# Altium footprint library Connector_PinHeader_1.00mm.PcbLib: 278 footprints (part 6 of 18) (continued)
## PinHeader_1x23_P1.00mm_Horizontal [mm] (continued)
  text "'.Designator'" at 1.254,-13.428 h0.6

## PinHeader_1x23_P1.00mm_Vertical [mm]
pads (23):
  rect 0.85x0.85 hole 0.5: 1(0,0)
  rrect100% 0.85x0.85 hole 0.5: 2(0,-1) 3(0,-2) 4(0,-3) 5(0,-4) 6(0,-5) 7(0,-6) 8(0,-7) 9(0,-8) 10(0,-9) 11(0,-10) 12(0,-11) 13(0,-12) 14(0,-13) 15(0,-14) 16(0,-15) 17(0,-16) 18(0,-17) 19(0,-18) 20(0,-19) 21(0,-20) 22(0,-21) 23(0,-22)
F.SilkS:
  lines w0.12: -0.695,0 -0.695,0.685 0,0.685 ; -0.608,-0.685 -0.695,-0.685 -0.695,-22.56 -0.394,-22.56 ; 0.394,-22.56 0.695,-22.56 0.695,-0.685 0.608,-0.685
F.CrtYd:
  lines w0.05: -1.15,-23 -1.15,1 1.15,1 1.15,-23 -1.15,-23
F.Fab:
  lines w0.1: -0.635,-22.5 -0.635,0.182 -0.318,0.5 0.635,0.5 0.635,-22.5 -0.635,-22.5
  text "'.Designator'" at 0.639,-14.076 h0.76

## PinHeader_1x23_P1.00mm_Vertical_SMD_Pin1Left [mm]
pads (23):
  rect 1.75x0.6 smd: 1(-0.875,11) 2(0.875,10) 3(-0.875,9) 4(0.875,8) 5(-0.875,7) 6(0.875,6) 7(-0.875,5) 8(0.875,4) 9(-0.875,3) 10(0.875,2) 11(-0.875,1) 12(0.875,0) 13(-0.875,-1) 14(0.875,-2) 15(-0.875,-3) 16(0.875,-4) 17(-0.875,-5) 18(0.875,-6) 19(-0.875,-7) 20(0.875,-8) 21(-0.875,-9) 22(0.875,-10) 23(-0.875,-11)
F.SilkS:
  lines w0.12: -1.69,11.56 -0.695,11.56 0.695,11.56 0.695,10.56 ; -0.695,-11.56 0.695,-11.56 0.695,-10.56 ; -0.695,-10.44 -0.695,-9.56 ; -0.695,-8.44 -0.695,-7.56 ; -0.695,-6.44 -0.695,-5.56 ; -0.695,-4.44 -0.695,-3.56 ; -0.695,-2.44 -0.695,-1.56 ; -0.695,-0.44 -0.695,0.44 ; -0.695,1.56 -0.695,2.44 ; -0.695,3.56 -0.695,4.44 ; -0.695,5.56 -0.695,6.44 ; -0.695,7.56 -0.695,8.44 ; -0.695,9.56 -0.695,10.44 ; 0.695,-9.44 0.695,-8.56 ; 0.695,-7.44 0.695,-6.56 ; 0.695,-5.44 0.695,-4.56 ; 0.695,-3.44 0.695,-2.56 ; 0.695,-1.44 0.695,-0.56 ; 0.695,0.56 0.695,1.44 ; 0.695,2.56 0.695,3.44 ; 0.695,4.56 0.695,5.44 ; 0.695,6.56 0.695,7.44 ; 0.695,8.56 0.695,9.44
F.CrtYd:
  lines w0.05: -2.25,-12 -2.25,12 2.25,12 2.25,-12 -2.25,-12
F.Fab:
  lines w0.1: -0.635,-11.15 -1.25,-11.15 -1.25,-10.85 -0.635,-10.85 ; -0.635,-9.15 -1.25,-9.15 -1.25,-8.85 -0.635,-8.85 ; -0.635,-7.15 -1.25,-7.15 -1.25,-6.85 -0.635,-6.85 ; -0.635,-5.15 -1.25,-5.15 -1.25,-4.85 -0.635,-4.85 ; -0.635,-3.15 -1.25,-3.15 -1.25,-2.85 -0.635,-2.85 ; -0.635,-1.15 -1.25,-1.15 -1.25,-0.85 -0.635,-0.85 ; -0.635,0.85 -1.25,0.85 -1.25,1.15 -0.635,1.15 ; -0.635,2.85 -1.25,2.85 -1.25,3.15 -0.635,3.15 ; -0.635,4.85 -1.25,4.85 -1.25,5.15 -0.635,5.15 ; -0.635,6.85 -1.25,6.85 -1.25,7.15 -0.635,7.15 ; -0.635,8.85 -1.25,8.85 -1.25,9.15 -0.635,9.15 ; -0.635,10.85 -1.25,10.85 -1.25,11.15 -0.635,11.15 ; 0.635,-10.15 1.25,-10.15 1.25,-9.85 0.635,-9.85 ; 0.635,-8.15 1.25,-8.15 1.25,-7.85 0.635,-7.85 ; 0.635,-6.15 1.25,-6.15 1.25,-5.85 0.635,-5.85 ; 0.635,-4.15 1.25,-4.15 1.25,-3.85 0.635,-3.85 ; 0.635,-2.15 1.25,-2.15 1.25,-1.85 0.635,-1.85 ; 0.635,-0.15 1.25,-0.15 1.25,0.15 0.635,0.15 ; 0.635,1.85 1.25,1.85 1.25,2.15 0.635,2.15 ; 0.635,3.85 1.25,3.85 1.25,4.15 0.635,4.15 ; 0.635,5.85 1.25,5.85 1.25,6.15 0.635,6.15 ; 0.635,7.85 1.25,7.85 1.25,8.15 0.635,8.15 ; 0.635,9.85 1.25,9.85 1.25,10.15 0.635,10.15 ; -0.635,11.15 -0.285,11.5 0.635,11.5 0.635,-11.5 -0.635,-11.5 -0.635,11.15
  text "'.Designator'" at 0.84,-4.047 h1

## PinHeader_1x23_P1.00mm_Vertical_SMD_Pin1Right [mm]
pads (23):
  rect 1.75x0.6 smd: 1(0.875,11) 2(-0.875,10) 3(0.875,9) 4(-0.875,8) 5(0.875,7) 6(-0.875,6) 7(0.875,5) 8(-0.875,4) 9(0.875,3) 10(-0.875,2) 11(0.875,1) 12(-0.875,0) 13(0.875,-1) 14(-0.875,-2) 15(0.875,-3) 16(-0.875,-4) 17(0.875,-5) 18(-0.875,-6) 19(0.875,-7) 20(-0.875,-8) 21(0.875,-9) 22(-0.875,-10) 23(0.875,-11)
F.SilkS:
  lines w0.12: -0.695,-10.56 -0.695,-11.56 0.695,-11.56 ; -0.695,-9.44 -0.695,-8.56 ; -0.695,-7.44 -0.695,-6.56 ; -0.695,-5.44 -0.695,-4.56 ; -0.695,-3.44 -0.695,-2.56 ; -0.695,-1.44 -0.695,-0.56 ; -0.695,0.56 -0.695,1.44 ; -0.695,2.56 -0.695,3.44 ; -0.695,4.56 -0.695,5.44 ; -0.695,6.56 -0.695,7.44 ; -0.695,8.56 -0.695,9.44 ; -0.695,11.44 -0.695,10.56 -0.695,11.56 0.695,11.56 1.69,11.56 ; 0.695,-10.44 0.695,-9.56 ; 0.695,-8.44 0.695,-7.56 ; 0.695,-6.44 0.695,-5.56 ; 0.695,-4.44 0.695,-3.56 ; 0.695,-2.44 0.695,-1.56 ; 0.695,-0.44 0.695,0.44 ; 0.695,1.56 0.695,2.44 ; 0.695,3.56 0.695,4.44 ; 0.695,5.56 0.695,6.44 ; 0.695,7.56 0.695,8.44 ; 0.695,9.56 0.695,10.44
F.CrtYd:
  lines w0.05: -2.25,-12 -2.25,12 2.25,12 2.25,-12 -2.25,-12
F.Fab:
  lines w0.1: -0.635,-10.15 -1.25,-10.15 -1.25,-9.85 -0.635,-9.85 ; -0.635,-8.15 -1.25,-8.15 -1.25,-7.85 -0.635,-7.85 ; -0.635,-6.15 -1.25,-6.15 -1.25,-5.85 -0.635,-5.85 ; -0.635,-4.15 -1.25,-4.15 -1.25,-3.85 -0.635,-3.85 ; -0.635,-2.15 -1.25,-2.15 -1.25,-1.85 -0.635,-1.85 ; -0.635,-0.15 -1.25,-0.15 -1.25,0.15 -0.635,0.15 ; -0.635,1.85 -1.25,1.85 -1.25,2.15 -0.635,2.15 ; -0.635,3.85 -1.25,3.85 -1.25,4.15 -0.635,4.15 ; -0.635,5.85 -1.25,5.85 -1.25,6.15 -0.635,6.15 ; -0.635,7.85 -1.25,7.85 -1.25,8.15 -0.635,8.15 ; -0.635,9.85 -1.25,9.85 -1.25,10.15 -0.635,10.15 ; 0.635,-11.15 1.25,-11.15 1.25,-10.85 0.635,-10.85 ; 0.635,-9.15 1.25,-9.15 1.25,-8.85 0.635,-8.85 ; 0.635,-7.15 1.25,-7.15 1.25,-6.85 0.635,-6.85 ; 0.635,-5.15 1.25,-5.15 1.25,-4.85 0.635,-4.85 ; 0.635,-3.15 1.25,-3.15 1.25,-2.85 0.635,-2.85 ; 0.635,-1.15 1.25,-1.15 1.25,-0.85 0.635,-0.85 ; 0.635,0.85 1.25,0.85 1.25,1.15 0.635,1.15 ; 0.635,2.85 1.25,2.85 1.25,3.15 0.635,3.15 ; 0.635,4.85 1.25,4.85 1.25,5.15 0.635,5.15 ; 0.635,6.85 1.25,6.85 1.25,7.15 0.635,7.15 ; 0.635,8.85 1.25,8.85 1.25,9.15 0.635,9.15 ; 0.635,10.85 1.25,10.85 1.25,11.15 0.635,11.15 ; 0.635,11.15 0.635,-11.5 -0.635,-11.5 -0.635,11.5 0.285,11.5 0.635,11.15
  text "'.Designator'" at 0.84,-4.047 h1

## PinHeader_1x24_P1.00mm_Horizontal [mm]
pads (24):
  rect 0.85x0.85 hole 0.5: 1(0,0)
  rrect100% 0.85x0.85 hole 0.5: 2(0,-1) 3(0,-2) 4(0,-3) 5(0,-4) 6(0,-5) 7(0,-6) 8(0,-7) 9(0,-8) 10(0,-9) 11(0,-10) 12(0,-11) 13(0,-12) 14(0,-13) 15(0,-14) 16(0,-15) 17(0,-16) 18(0,-17) 19(0,-18) 20(0,-19) 21(0,-20) 22(0,-21) 23(0,-22) 24(0,-23)
F.SilkS:
  lines w0.12: -0.685,0 -0.685,0.685 0,0.685 ; 0.394,-23.56 1.31,-23.56 1.31,0.56 0.685,0.56 ; 0.468,-22.5 1.31,-22.5 ; 0.468,-21.5 1.31,-21.5 ; 0.468,-20.5 1.31,-20.5 ; 0.468,-19.5 1.31,-19.5 ; 0.468,-18.5 1.31,-18.5 ; 0.468,-17.5 1.31,-17.5 ; 0.468,-16.5 1.31,-16.5 ; 0.468,-15.5 1.31,-15.5 ; 0.468,-14.5 1.31,-14.5 ; 0.468,-13.5 1.31,-13.5 ; 0.468,-12.5 1.31,-12.5 ; 0.468,-11.5 1.31,-11.5 ; 0.468,-10.5 1.31,-10.5 ; 0.468,-9.5 1.31,-9.5 ; 0.468,-8.5 1.31,-8.5 ; 0.468,-7.5 1.31,-7.5 ; 0.468,-6.5 1.31,-6.5 ; 0.468,-5.5 1.31,-5.5 ; 0.468,-4.5 1.31,-4.5 ; 0.468,-3.5 1.31,-3.5 ; 0.468,-2.5 1.31,-2.5 ; 0.468,-1.5 1.31,-1.5 ; 0.685,-0.5 1.31,-0.5 ; 1.31,-23.21 3.31,-23.21 3.31,-22.79 1.31,-22.79 ; 1.31,-22.21 3.31,-22.21 3.31,-21.79 1.31,-21.79 ; 1.31,-21.21 3.31,-21.21 3.31,-20.79 1.31,-20.79 ; 1.31,-20.21 3.31,-20.21 3.31,-19.79 1.31,-19.79 ; 1.31,-19.21 3.31,-19.21 3.31,-18.79 1.31,-18.79 ; 1.31,-18.21 3.31,-18.21 3.31,-17.79 1.31,-17.79 ; 1.31,-17.21 3.31,-17.21 3.31,-16.79 1.31,-16.79 ; 1.31,-16.21 3.31,-16.21 3.31,-15.79 1.31,-15.79 ; 1.31,-15.21 3.31,-15.21 3.31,-14.79 1.31,-14.79 ; 1.31,-14.21 3.31,-14.21 3.31,-13.79 1.31,-13.79 ; 1.31,-13.21 3.31,-13.21 3.31,-12.79 1.31,-12.79 ; 1.31,-12.21 3.31,-12.21 3.31,-11.79 1.31,-11.79 ; 1.31,-11.21 3.31,-11.21 3.31,-10.79 1.31,-10.79 ; 1.31,-10.21 3.31,-10.21 3.31,-9.79 1.31,-9.79 ; 1.31,-9.21 3.31,-9.21 3.31,-8.79 1.31,-8.79 ; 1.31,-8.21 3.31,-8.21 3.31,-7.79 1.31,-7.79 ; 1.31,-7.21 3.31,-7.21 3.31,-6.79 1.31,-6.79 ; 1.31,-6.21 3.31,-6.21 3.31,-5.79 1.31,-5.79 ; 1.31,-5.21 3.31,-5.21 3.31,-4.79 1.31,-4.79 ; 1.31,-4.21 3.31,-4.21 3.31,-3.79 1.31,-3.79 ; 1.31,-3.21 3.31,-3.21 3.31,-2.79 1.31,-2.79 ; 1.31,-2.21 3.31,-2.21 3.31,-1.79 1.31,-1.79 ; 1.31,-1.21 3.31,-1.21 3.31,-0.79 1.31,-0.79 ; 1.31,-0.21 3.31,-0.21 3.31,0.21 1.31,0.21 ; 1.31,-0.09 3.31,-0.09 ; 1.31,0.03 3.31,0.03 ; 1.31,0.15 3.31,0.15
F.CrtYd:
  lines w0.05: -1,-24 -1,1 3.75,1 3.75,-24 -1,-24
F.Fab:
  lines w0.1: 0.25,-23.15 -0.15,-23.15 -0.15,-22.85 0.25,-22.85 ; 0.25,-22.15 -0.15,-22.15 -0.15,-21.85 0.25,-21.85 ; 0.25,-21.15 -0.15,-21.15 -0.15,-20.85 0.25,-20.85 ; 0.25,-20.15 -0.15,-20.15 -0.15,-19.85 0.25,-19.85 ; 0.25,-19.15 -0.15,-19.15 -0.15,-18.85 0.25,-18.85 ; 0.25,-18.15 -0.15,-18.15 -0.15,-17.85 0.25,-17.85 ; 0.25,-17.15 -0.15,-17.15 -0.15,-16.85 0.25,-16.85 ; 0.25,-16.15 -0.15,-16.15 -0.15,-15.85 0.25,-15.85 ; 0.25,-15.15 -0.15,-15.15 -0.15,-14.85 0.25,-14.85 ; 0.25,-14.15 -0.15,-14.15 -0.15,-13.85 0.25,-13.85 ; 0.25,-13.15 -0.15,-13.15 -0.15,-12.85 0.25,-12.85 ; 0.25,-12.15 -0.15,-12.15 -0.15,-11.85 0.25,-11.85 ; 0.25,-11.15 -0.15,-11.15 -0.15,-10.85 0.25,-10.85 ; 0.25,-10.15 -0.15,-10.15 -0.15,-9.85 0.25,-9.85 ; 0.25,-9.15 -0.15,-9.15 -0.15,-8.85 0.25,-8.85 ; 0.25,-8.15 -0.15,-8.15 -0.15,-7.85 0.25,-7.85 ; 0.25,-7.15 -0.15,-7.15 -0.15,-6.85 0.25,-6.85 ; 0.25,-6.15 -0.15,-6.15 -0.15,-5.85 0.25,-5.85 ; 0.25,-5.15 -0.15,-5.15 -0.15,-4.85 0.25,-4.85 ; 0.25,-4.15 -0.15,-4.15 -0.15,-3.85 0.25,-3.85 ; 0.25,-3.15 -0.15,-3.15 -0.15,-2.85 0.25,-2.85 ; 0.25,-2.15 -0.15,-2.15 -0.15,-1.85 0.25,-1.85 ; 0.25,-1.15 -0.15,-1.15 -0.15,-0.85 0.25,-0.85 ; 0.25,-0.15 -0.15,-0.15 -0.15,0.15 0.25,0.15 ; 1.25,-23.15 3.25,-23.15 3.25,-22.85 1.25,-22.85 ; 1.25,-22.15 3.25,-22.15 3.25,-21.85 1.25,-21.85 ; 1.25,-21.15 3.25,-21.15 3.25,-20.85 1.25,-20.85 ; 1.25,-20.15 3.25,-20.15 3.25,-19.85 1.25,-19.85 ; 1.25,-19.15 3.25,-19.15 3.25,-18.85 1.25,-18.85 ; 1.25,-18.15 3.25,-18.15 3.25,-17.85 1.25,-17.85 ; 1.25,-17.15 3.25,-17.15 3.25,-16.85 1.25,-16.85 ; 1.25,-16.15 3.25,-16.15 3.25,-15.85 1.25,-15.85 ; 1.25,-15.15 3.25,-15.15 3.25,-14.85 1.25,-14.85 ; 1.25,-14.15 3.25,-14.15 3.25,-13.85 1.25,-13.85 ; 1.25,-13.15 3.25,-13.15 3.25,-12.85 1.25,-12.85 ; 1.25,-12.15 3.25,-12.15 3.25,-11.85 1.25,-11.85 ; 1.25,-11.15 3.25,-11.15 3.25,-10.85 1.25,-10.85 ; 1.25,-10.15 3.25,-10.15 3.25,-9.85 1.25,-9.85 ; 1.25,-9.15 3.25,-9.15 3.25,-8.85 1.25,-8.85 ; 1.25,-8.15 3.25,-8.15 3.25,-7.85 1.25,-7.85 ; 1.25,-7.15 3.25,-7.15 3.25,-6.85 1.25,-6.85 ; 1.25,-6.15 3.25,-6.15 3.25,-5.85 1.25,-5.85 ; 1.25,-5.15 3.25,-5.15 3.25,-4.85 1.25,-4.85 ; 1.25,-4.15 3.25,-4.15 3.25,-3.85 1.25,-3.85 ; 1.25,-3.15 3.25,-3.15 3.25,-2.85 1.25,-2.85 ; 1.25,-2.15 3.25,-2.15 3.25,-1.85 1.25,-1.85 ; 1.25,-1.15 3.25,-1.15 3.25,-0.85 1.25,-0.85 ; 1.25,-0.15 3.25,-0.15 3.25,0.15 1.25,0.15 ; 0.25,-23.5 0.25,0.25 0.5,0.5 1.25,0.5 1.25,-23.5 0.25,-23.5
  text "'.Designator'" at 1.254,-13.928 h0.6

## PinHeader_1x24_P1.00mm_Vertical [mm]
pads (24):
  rect 0.85x0.85 hole 0.5: 1(0,0)
  rrect100% 0.85x0.85 hole 0.5: 2(0,-1) 3(0,-2) 4(0,-3) 5(0,-4) 6(0,-5) 7(0,-6) 8(0,-7) 9(0,-8) 10(0,-9) 11(0,-10) 12(0,-11) 13(0,-12) 14(0,-13) 15(0,-14) 16(0,-15) 17(0,-16) 18(0,-17) 19(0,-18) 20(0,-19) 21(0,-20) 22(0,-21) 23(0,-22) 24(0,-23)
F.SilkS:
  lines w0.12: -0.695,0 -0.695,0.685 0,0.685 ; -0.608,-0.685 -0.695,-0.685 -0.695,-23.56 -0.394,-23.56 ; 0.394,-23.56 0.695,-23.56 0.695,-0.685 0.608,-0.685
F.CrtYd:
  lines w0.05: -1.15,-24 -1.15,1 1.15,1 1.15,-24 -1.15,-24
F.Fab:
  lines w0.1: -0.635,-23.5 -0.635,0.182 -0.318,0.5 0.635,0.5 0.635,-23.5 -0.635,-23.5
  text "'.Designator'" at 0.639,-14.576 h0.76

## PinHeader_1x24_P1.00mm_Vertical_SMD_Pin1Left [mm]
pads (24):
  rect 1.75x0.6 smd: 1(-0.875,11.5) 2(0.875,10.5) 3(-0.875,9.5) 4(0.875,8.5) 5(-0.875,7.5) 6(0.875,6.5) 7(-0.875,5.5) 8(0.875,4.5) 9(-0.875,3.5) 10(0.875,2.5) 11(-0.875,1.5) 12(0.875,0.5) 13(-0.875,-0.5) 14(0.875,-1.5) 15(-0.875,-2.5) 16(0.875,-3.5) 17(-0.875,-4.5) 18(0.875,-5.5) 19(-0.875,-6.5) 20(0.875,-7.5) 21(-0.875,-8.5) 22(0.875,-9.5) 23(-0.875,-10.5) 24(0.875,-11.5)
F.SilkS:
  lines w0.12: -1.69,12.06 -0.695,12.06 0.695,12.06 0.695,11.06 ; -0.695,-11.06 -0.695,-12.06 0.695,-12.06 ; -0.695,-9.94 -0.695,-9.06 ; -0.695,-7.94 -0.695,-7.06 ; -0.695,-5.94 -0.695,-5.06 ; -0.695,-3.94 -0.695,-3.06 ; -0.695,-1.94 -0.695,-1.06 ; -0.695,0.06 -0.695,0.94 ; -0.695,2.06 -0.695,2.94 ; -0.695,4.06 -0.695,4.94 ; -0.695,6.06 -0.695,6.94 ; -0.695,8.06 -0.695,8.94 ; -0.695,10.06 -0.695,10.94 ; 0.695,-10.94 0.695,-10.06 ; 0.695,-8.94 0.695,-8.06 ; 0.695,-6.94 0.695,-6.06 ; 0.695,-4.94 0.695,-4.06 ; 0.695,-2.94 0.695,-2.06 ; 0.695,-0.94 0.695,-0.06 ; 0.695,1.06 0.695,1.94 ; 0.695,3.06 0.695,3.94 ; 0.695,5.06 0.695,5.94 ; 0.695,7.06 0.695,7.94 ; 0.695,9.06 0.695,9.94
F.CrtYd:
  lines w0.05: -2.25,-12.5 2.25,-12.5 2.25,12.5 -2.25,12.5 -2.25,-12.5
F.Fab:
  lines w0.1: -0.635,-10.65 -1.25,-10.65 -1.25,-10.35 -0.635,-10.35 ; -0.635,-8.65 -1.25,-8.65 -1.25,-8.35 -0.635,-8.35 ; -0.635,-6.65 -1.25,-6.65 -1.25,-6.35 -0.635,-6.35 ; -0.635,-4.65 -1.25,-4.65 -1.25,-4.35 -0.635,-4.35 ; -0.635,-2.65 -1.25,-2.65 -1.25,-2.35 -0.635,-2.35 ; -0.635,-0.65 -1.25,-0.65 -1.25,-0.35 -0.635,-0.35 ; -0.635,1.35 -1.25,1.35 -1.25,1.65 -0.635,1.65 ; -0.635,3.35 -1.25,3.35 -1.25,3.65 -0.635,3.65 ; -0.635,5.35 -1.25,5.35 -1.25,5.65 -0.635,5.65 ; -0.635,7.35 -1.25,7.35 -1.25,7.65 -0.635,7.65 ; -0.635,9.35 -1.25,9.35 -1.25,9.65 -0.635,9.65 ; -0.635,11.35 -1.25,11.35 -1.25,11.65 -0.635,11.65 ; 0.635,-11.65 1.25,-11.65 1.25,-11.35 0.635,-11.35 ; 0.635,-9.65 1.25,-9.65 1.25,-9.35 0.635,-9.35 ; 0.635,-7.65 1.25,-7.65 1.25,-7.35 0.635,-7.35 ; 0.635,-5.65 1.25,-5.65 1.25,-5.35 0.635,-5.35 ; 0.635,-3.65 1.25,-3.65 1.25,-3.35 0.635,-3.35 ; 0.635,-1.65 1.25,-1.65 1.25,-1.35 0.635,-1.35 ; 0.635,0.35 1.25,0.35 1.25,0.65 0.635,0.65 ; 0.635,2.35 1.25,2.35 1.25,2.65 0.635,2.65 ; 0.635,4.35 1.25,4.35 1.25,4.65 0.635,4.65 ; 0.635,6.35 1.25,6.35 1.25,6.65 0.635,6.65 ; 0.635,8.35 1.25,8.35 1.25,8.65 0.635,8.65 ; 0.635,10.35 1.25,10.35 1.25,10.65 0.635,10.65 ; -0.635,11.65 -0.635,-12 0.635,-12 0.635,12 -0.285,12 -0.635,11.65
  text "'.Designator'" at 0.84,-4.047 h1

## PinHeader_1x24_P1.00mm_Vertical_SMD_Pin1Right [mm]
pads (24):
  rect 1.75x0.6 smd: 1(0.875,11.5) 2(-0.875,10.5) 3(0.875,9.5) 4(-0.875,8.5) 5(0.875,7.5) 6(-0.875,6.5) 7(0.875,5.5) 8(-0.875,4.5) 9(0.875,3.5) 10(-0.875,2.5) 11(0.875,1.5) 12(-0.875,0.5) 13(0.875,-0.5) 14(-0.875,-1.5) 15(0.875,-2.5) 16(-0.875,-3.5) 17(0.875,-4.5) 18(-0.875,-5.5) 19(0.875,-6.5) 20(-0.875,-7.5) 21(0.875,-8.5) 22(-0.875,-9.5) 23(0.875,-10.5) 24(-0.875,-11.5)
F.SilkS:
  lines w0.12: -0.695,-12.06 0.695,-12.06 0.695,-11.06 ; -0.695,-10.94 -0.695,-10.06 ; -0.695,-8.94 -0.695,-8.06 ; -0.695,-6.94 -0.695,-6.06 ; -0.695,-4.94 -0.695,-4.06 ; -0.695,-2.94 -0.695,-2.06 ; -0.695,-0.94 -0.695,-0.06 ; -0.695,1.06 -0.695,1.94 ; -0.695,3.06 -0.695,3.94 ; -0.695,5.06 -0.695,5.94 ; -0.695,7.06 -0.695,7.94 ; -0.695,9.06 -0.695,9.94 ; -0.695,11.94 -0.695,11.06 -0.695,12.06 0.695,12.06 1.69,12.06 ; 0.695,-9.94 0.695,-9.06 ; 0.695,-7.94 0.695,-7.06 ; 0.695,-5.94 0.695,-5.06 ; 0.695,-3.94 0.695,-3.06 ; 0.695,-1.94 0.695,-1.06 ; 0.695,0.06 0.695,0.94 ; 0.695,2.06 0.695,2.94 ; 0.695,4.06 0.695,4.94 ; 0.695,6.06 0.695,6.94 ; 0.695,8.06 0.695,8.94 ; 0.695,10.06 0.695,10.94
F.CrtYd:
  lines w0.05: -2.25,-12.5 2.25,-12.5 2.25,12.5 -2.25,12.5 -2.25,-12.5
F.Fab:
  lines w0.1: -0.635,-11.65 -1.25,-11.65 -1.25,-11.35 -0.635,-11.35 ; -0.635,-9.65 -1.25,-9.65 -1.25,-9.35 -0.635,-9.35 ; -0.635,-7.65 -1.25,-7.65 -1.25,-7.35 -0.635,-7.35 ; -0.635,-5.65 -1.25,-5.65 -1.25,-5.35 -0.635,-5.35 ; -0.635,-3.65 -1.25,-3.65 -1.25,-3.35 -0.635,-3.35 ; -0.635,-1.65 -1.25,-1.65 -1.25,-1.35 -0.635,-1.35 ; -0.635,0.35 -1.25,0.35 -1.25,0.65 -0.635,0.65 ; -0.635,2.35 -1.25,2.35 -1.25,2.65 -0.635,2.65 ; -0.635,4.35 -1.25,4.35 -1.25,4.65 -0.635,4.65 ; -0.635,6.35 -1.25,6.35 -1.25,6.65 -0.635,6.65 ; -0.635,8.35 -1.25,8.35 -1.25,8.65 -0.635,8.65 ; -0.635,10.35 -1.25,10.35 -1.25,10.65 -0.635,10.65 ; 0.635,-10.65 1.25,-10.65 1.25,-10.35 0.635,-10.35 ; 0.635,-8.65 1.25,-8.65 1.25,-8.35 0.635,-8.35 ; 0.635,-6.65 1.25,-6.65 1.25,-6.35 0.635,-6.35 ; 0.635,-4.65 1.25,-4.65 1.25,-4.35 0.635,-4.35 ; 0.635,-2.65 1.25,-2.65 1.25,-2.35 0.635,-2.35 ; 0.635,-0.65 1.25,-0.65 1.25,-0.35 0.635,-0.35 ; 0.635,1.35 1.25,1.35 1.25,1.65 0.635,1.65 ; 0.635,3.35 1.25,3.35 1.25,3.65 0.635,3.65 ; 0.635,5.35 1.25,5.35 1.25,5.65 0.635,5.65 ; 0.635,7.35 1.25,7.35 1.25,7.65 0.635,7.65 ; 0.635,9.35 1.25,9.35 1.25,9.65 0.635,9.65 ; 0.635,11.35 1.25,11.35 1.25,11.65 0.635,11.65 ; 0.635,11.65 0.285,12 -0.635,12 -0.635,-12 0.635,-12 0.635,11.65
  text "'.Designator'" at 0.84,-4.047 h1

## PinHeader_1x25_P1.00mm_Horizontal [mm]
pads (25):
  rect 0.85x0.85 hole 0.5: 1(0,0)
  rrect100% 0.85x0.85 hole 0.5: 2(0,-1) 3(0,-2) 4(0,-3) 5(0,-4) 6(0,-5) 7(0,-6) 8(0,-7) 9(0,-8) 10(0,-9) 11(0,-10) 12(0,-11) 13(0,-12) 14(0,-13) 15(0,-14) 16(0,-15) 17(0,-16) 18(0,-17) 19(0,-18) 20(0,-19) 21(0,-20) 22(0,-21) 23(0,-22) 24(0,-23) 25(0,-24)
F.SilkS:
  lines w0.12: -0.685,0 -0.685,0.685 0,0.685 ; 0.394,-24.56 1.31,-24.56 1.31,0.56 0.685,0.56 ; 0.468,-23.5 1.31,-23.5 ; 0.468,-22.5 1.31,-22.5 ; 0.468,-21.5 1.31,-21.5 ; 0.468,-20.5 1.31,-20.5 ; 0.468,-19.5 1.31,-19.5 ; 0.468,-18.5 1.31,-18.5 ; 0.468,-17.5 1.31,-17.5 ; 0.468,-16.5 1.31,-16.5 ; 0.468,-15.5 1.31,-15.5 ; 0.468,-14.5 1.31,-14.5 ; 0.468,-13.5 1.31,-13.5 ; 0.468,-12.5 1.31,-12.5 ; 0.468,-11.5 1.31,-11.5 ; 0.468,-10.5 1.31,-10.5 ; 0.468,-9.5 1.31,-9.5 ; 0.468,-8.5 1.31,-8.5 ; 0.468,-7.5 1.31,-7.5 ; 0.468,-6.5 1.31,-6.5 ; 0.468,-5.5 1.31,-5.5 ; 0.468,-4.5 1.31,-4.5 ; 0.468,-3.5 1.31,-3.5 ; 0.468,-2.5 1.31,-2.5 ; 0.468,-1.5 1.31,-1.5 ; 0.685,-0.5 1.31,-0.5 ; 1.31,-24.21 3.31,-24.21 3.31,-23.79 1.31,-23.79 ; 1.31,-23.21 3.31,-23.21 3.31,-22.79 1.31,-22.79 ; 1.31,-22.21 3.31,-22.21 3.31,-21.79 1.31,-21.79 ; 1.31,-21.21 3.31,-21.21 3.31,-20.79 1.31,-20.79 ; 1.31,-20.21 3.31,-20.21 3.31,-19.79 1.31,-19.79 ; 1.31,-19.21 3.31,-19.21 3.31,-18.79 1.31,-18.79 ; 1.31,-18.21 3.31,-18.21 3.31,-17.79 1.31,-17.79 ; 1.31,-17.21 3.31,-17.21 3.31,-16.79 1.31,-16.79 ; 1.31,-16.21 3.31,-16.21 3.31,-15.79 1.31,-15.79 ; 1.31,-15.21 3.31,-15.21 3.31,-14.79 1.31,-14.79 ; 1.31,-14.21 3.31,-14.21 3.31,-13.79 1.31,-13.79 ; 1.31,-13.21 3.31,-13.21 3.31,-12.79 1.31,-12.79 ; 1.31,-12.21 3.31,-12.21 3.31,-11.79 1.31,-11.79 ; 1.31,-11.21 3.31,-11.21 3.31,-10.79 1.31,-10.79 ; 1.31,-10.21 3.31,-10.21 3.31,-9.79 1.31,-9.79 ; 1.31,-9.21 3.31,-9.21 3.31,-8.79 1.31,-8.79 ; 1.31,-8.21 3.31,-8.21 3.31,-7.79 1.31,-7.79 ; 1.31,-7.21 3.31,-7.21 3.31,-6.79 1.31,-6.79 ; 1.31,-6.21 3.31,-6.21 3.31,-5.79 1.31,-5.79 ; 1.31,-5.21 3.31,-5.21 3.31,-4.79 1.31,-4.79 ; 1.31,-4.21 3.31,-4.21 3.31,-3.79 1.31,-3.79 ; 1.31,-3.21 3.31,-3.21 3.31,-2.79 1.31,-2.79 ; 1.31,-2.21 3.31,-2.21 3.31,-1.79 1.31,-1.79 ; 1.31,-1.21 3.31,-1.21 3.31,-0.79 1.31,-0.79 ; 1.31,-0.21 3.31,-0.21 3.31,0.21 1.31,0.21 ; 1.31,-0.09 3.31,-0.09 ; 1.31,0.03 3.31,0.03 ; 1.31,0.15 3.31,0.15
F.CrtYd:
  lines w0.05: -1,-25 -1,1 3.75,1 3.75,-25 -1,-25
F.Fab:
  drawing of 155 lines, arcs and shapes, not listed
  text "'.Designator'" at 1.254,-14.428 h0.6

## PinHeader_1x25_P1.00mm_Vertical [mm]
pads (25):
  rect 0.85x0.85 hole 0.5: 1(0,0)
  rrect100% 0.85x0.85 hole 0.5: 2(0,-1) 3(0,-2) 4(0,-3) 5(0,-4) 6(0,-5) 7(0,-6) 8(0,-7) 9(0,-8) 10(0,-9) 11(0,-10) 12(0,-11) 13(0,-12) 14(0,-13) 15(0,-14) 16(0,-15) 17(0,-16) 18(0,-17) 19(0,-18) 20(0,-19) 21(0,-20) 22(0,-21) 23(0,-22) 24(0,-23) 25(0,-24)
F.SilkS:
  lines w0.12: -0.695,0 -0.695,0.685 0,0.685 ; -0.608,-0.685 -0.695,-0.685 -0.695,-24.56 -0.394,-24.56 ; 0.394,-24.56 0.695,-24.56 0.695,-0.685 0.608,-0.685
F.CrtYd:
  lines w0.05: -1.15,-25 -1.15,1 1.15,1 1.15,-25 -1.15,-25
F.Fab:
  lines w0.1: -0.635,-24.5 -0.635,0.182 -0.318,0.5 0.635,0.5 0.635,-24.5 -0.635,-24.5
  text "'.Designator'" at 0.639,-15.076 h0.76